# Altium schematic symbol library jlcpcb_2025_04_capacitors_extended_0402.schlib: 3594 symbols (part 17 of 20)
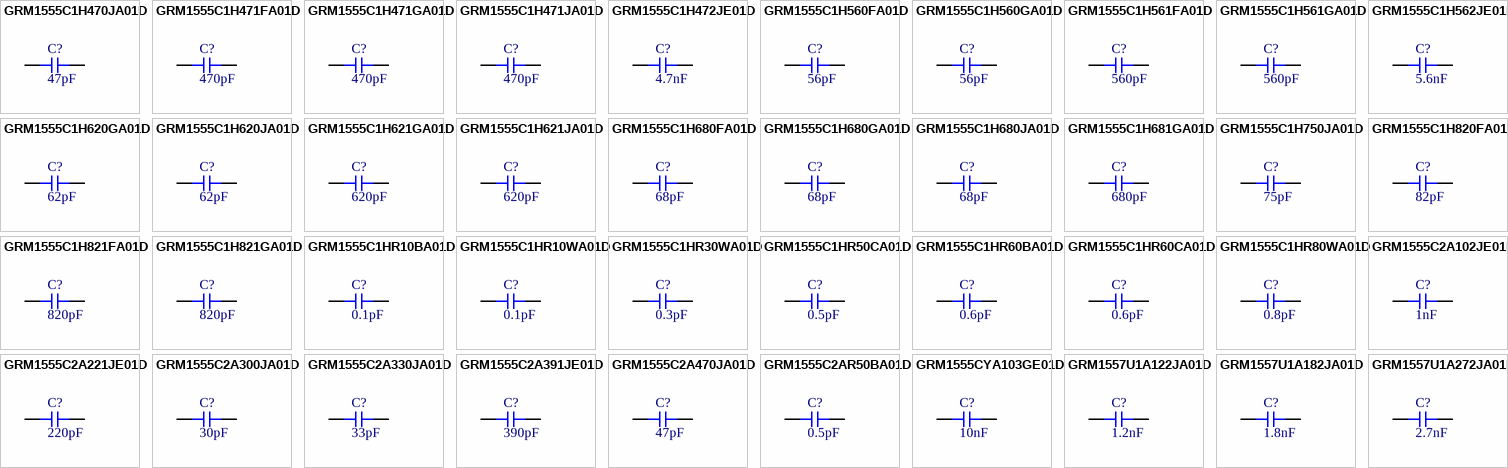
[diagram p105: symbols GRM1555C1H470JA01D to GRM1557U1A272JA01D]

## GRM1555C1H471FA01D
designator C?  Capacitance: 470pF  (hidden comment: *)
Capacitor, Ceramic (MLCC), 470pF, ±1%, 50V, C0G, ±1%, SMD 0402; Manufacturer: Murata Electronics; Manufacturer Part Number: GRM1555C1H471FA01D; Package Size: 0402; JLCPCB Basic Part: No; JLCPCB Part Number: C117605; Supplier 1: LCSC; Category: Capacitors - MLCC; Supplier Part Number 1: C117605; Tolerance: ±1%; Voltage Rating: 50V; Temperature Coefficient: C0G; RoHS: Yes; ComponentLink1Description: Datasheet; ComponentLink1URL: https://wmsc.lcsc.com/wmsc/upload/file/pdf/v2/lcsc/1811081510_Murata-Electronics-GRM1555C1H471FA01D_C117605.pdf; ComponentLink2Description: JLCPCB Part URL; ComponentLink2URL: https://jlcpcb.com/partdetail/C117605; ComponentLink3Description: LCSC Part URL; ComponentLink3URL: https://lcsc.com/product-detail/Multilayer-Ceramic-Capacitors-MLCC---SMD-SMT_Murata-Electronics-Murata-Electronics-GRM1555C1H471FA01D_C117605.html
footprint CAP-0402 (0402 (1005M) Capacitor)
pins: 1, 2

## GRM1555C1H471GA01D
designator C?  Capacitance: 470pF  (hidden comment: *)
Capacitor, Ceramic (MLCC), 470pF, ±2%, null, null, ±2%, SMD 0402; Manufacturer: Murata Electronics; Manufacturer Part Number: GRM1555C1H471GA01D; Package Size: 0402; JLCPCB Basic Part: No; JLCPCB Part Number: C701296; Supplier 1: LCSC; Category: Capacitors - MLCC; Supplier Part Number 1: C701296; Tolerance: ±2%; Voltage Rating: null; Temperature Coefficient: null; RoHS: Yes; ComponentLink1Description: Datasheet; ComponentLink1URL: https://wmsc.lcsc.com/wmsc/upload/file/pdf/v2/lcsc/2304140030_Murata-Electronics-GRM1555C1H471GA01D_C701296.pdf; ComponentLink2Description: JLCPCB Part URL; ComponentLink2URL: https://jlcpcb.com/partdetail/C701296; ComponentLink3Description: LCSC Part URL; ComponentLink3URL: https://lcsc.com/product-detail/Multilayer-Ceramic-Capacitors-MLCC---SMD-SMT_Murata-Electronics-Murata-Electronics-GRM1555C1H471GA01D_C701296.html
footprint CAP-0402 (0402 (1005M) Capacitor)
pins: 1, 2

## GRM1555C1H471JA01D
designator C?  Capacitance: 470pF  (hidden comment: *)
Capacitor, Ceramic (MLCC), 470pF, ±5%, 50V, C0G, ±5%, SMD 0402; Manufacturer: Murata Electronics; Manufacturer Part Number: GRM1555C1H471JA01D; Package Size: 0402; JLCPCB Basic Part: No; JLCPCB Part Number: C76971; Supplier 1: LCSC; Category: Capacitors - MLCC; Supplier Part Number 1: C76971; Tolerance: ±5%; Voltage Rating: 50V; Temperature Coefficient: C0G; RoHS: Yes; ComponentLink1Description: Datasheet; ComponentLink1URL: https://wmsc.lcsc.com/wmsc/upload/file/pdf/v2/lcsc/1811081616_Murata-Electronics-GRM1555C1H471JA01D_C76971.pdf; ComponentLink2Description: JLCPCB Part URL; ComponentLink2URL: https://jlcpcb.com/partdetail/C76971; ComponentLink3Description: LCSC Part URL; ComponentLink3URL: https://lcsc.com/product-detail/Multilayer-Ceramic-Capacitors-MLCC---SMD-SMT_Murata-Electronics-Murata-Electronics-GRM1555C1H471JA01D_C76971.html
footprint CAP-0402 (0402 (1005M) Capacitor)
pins: 1, 2

## GRM1555C1H472JE01D
designator C?  Capacitance: 4.7nF  (hidden comment: *)
Capacitor, Ceramic (MLCC), 4.7nF, ±5%, 50V, C0G, ±5%, SMD 0402; Manufacturer: Murata Electronics; Manufacturer Part Number: GRM1555C1H472JE01D; Package Size: 0402; JLCPCB Basic Part: No; JLCPCB Part Number: C1518204; Supplier 1: LCSC; Category: Capacitors - MLCC; Supplier Part Number 1: C1518204; Tolerance: ±5%; Voltage Rating: 50V; Temperature Coefficient: C0G; RoHS: Yes; ComponentLink1Description: Datasheet; ComponentLink1URL: https://wmsc.lcsc.com/wmsc/upload/file/pdf/v2/lcsc/2111031730_Murata-Electronics-GRM1555C1H472JE01D_C1518204.pdf; ComponentLink2Description: JLCPCB Part URL; ComponentLink2URL: https://jlcpcb.com/partdetail/C1518204; ComponentLink3Description: LCSC Part URL; ComponentLink3URL: https://lcsc.com/product-detail/Multilayer-Ceramic-Capacitors-MLCC---SMD-SMT_Murata-Electronics-Murata-Electronics-GRM1555C1H472JE01D_C1518204.html
footprint CAP-0402 (0402 (1005M) Capacitor)
pins: 1, 2

## GRM1555C1H560FA01D
designator C?  Capacitance: 56pF  (hidden comment: *)
Capacitor, Ceramic (MLCC), 56pF, ±1%, 50V, null, ±1%, SMD 0402; Manufacturer: Murata Electronics; Manufacturer Part Number: GRM1555C1H560FA01D; Package Size: 0402; JLCPCB Basic Part: No; JLCPCB Part Number: C162113; Supplier 1: LCSC; Category: Capacitors - MLCC; Supplier Part Number 1: C162113; Tolerance: ±1%; Voltage Rating: 50V; Temperature Coefficient: null; RoHS: Yes; ComponentLink1Description: Datasheet; ComponentLink1URL: https://wmsc.lcsc.com/wmsc/upload/file/pdf/v2/lcsc/2011191404_Murata-Electronics-GRM1555C1H560FA01D_C162113.pdf; ComponentLink2Description: JLCPCB Part URL; ComponentLink2URL: https://jlcpcb.com/partdetail/C162113; ComponentLink3Description: LCSC Part URL; ComponentLink3URL: https://lcsc.com/product-detail/Multilayer-Ceramic-Capacitors-MLCC---SMD-SMT_Murata-Electronics-Murata-Electronics-GRM1555C1H560FA01D_C162113.html
footprint CAP-0402 (0402 (1005M) Capacitor)
pins: 1, 2

## GRM1555C1H560GA01D
designator C?  Capacitance: 56pF  (hidden comment: *)
Capacitor, Ceramic (MLCC), 56pF, ±2%, 50V, null, ±2%, SMD 0402; Manufacturer: Murata Electronics; Manufacturer Part Number: GRM1555C1H560GA01D; Package Size: 0402; JLCPCB Basic Part: No; JLCPCB Part Number: C162114; Supplier 1: LCSC; Category: Capacitors - MLCC; Supplier Part Number 1: C162114; Tolerance: ±2%; Voltage Rating: 50V; Temperature Coefficient: null; RoHS: Yes; ComponentLink1Description: Datasheet; ComponentLink1URL: https://wmsc.lcsc.com/wmsc/upload/file/pdf/v2/lcsc/2105241135_Murata-Electronics-GRM1555C1H560GA01D_C162114.pdf; ComponentLink2Description: JLCPCB Part URL; ComponentLink2URL: https://jlcpcb.com/partdetail/C162114; ComponentLink3Description: LCSC Part URL; ComponentLink3URL: https://lcsc.com/product-detail/Multilayer-Ceramic-Capacitors-MLCC---SMD-SMT_Murata-Electronics-Murata-Electronics-GRM1555C1H560GA01D_C162114.html
footprint CAP-0402 (0402 (1005M) Capacitor)
pins: 1, 2

## GRM1555C1H561FA01D
designator C?  Capacitance: 560pF  (hidden comment: *)
Capacitor, Ceramic (MLCC), 560pF, ±1%, null, null, ±1%, SMD 0402; Manufacturer: Murata Electronics; Manufacturer Part Number: GRM1555C1H561FA01D; Package Size: 0402; JLCPCB Basic Part: No; JLCPCB Part Number: C907748; Supplier 1: LCSC; Category: Capacitors - MLCC; Supplier Part Number 1: C907748; Tolerance: ±1%; Voltage Rating: null; Temperature Coefficient: null; RoHS: Yes; ComponentLink1Description: Datasheet; ComponentLink1URL: https://wmsc.lcsc.com/wmsc/upload/file/pdf/v2/lcsc/2201242100_Murata-Electronics-GRM1555C1H561FA01D_C907748.pdf; ComponentLink2Description: JLCPCB Part URL; ComponentLink2URL: https://jlcpcb.com/partdetail/C907748; ComponentLink3Description: LCSC Part URL; ComponentLink3URL: https://lcsc.com/product-detail/Multilayer-Ceramic-Capacitors-MLCC---SMD-SMT_Murata-Electronics-Murata-Electronics-GRM1555C1H561FA01D_C907748.html
footprint CAP-0402 (0402 (1005M) Capacitor)
pins: 1, 2

## GRM1555C1H561GA01D
designator C?  Capacitance: 560pF  (hidden comment: *)
Capacitor, Ceramic (MLCC), 560pF, ±2%, 50V, C0G, ±2%, SMD 0402; Manufacturer: Murata Electronics; Manufacturer Part Number: GRM1555C1H561GA01D; Package Size: 0402; JLCPCB Basic Part: No; JLCPCB Part Number: C440169; Supplier 1: LCSC; Category: Capacitors - MLCC; Supplier Part Number 1: C440169; Tolerance: ±2%; Voltage Rating: 50V; Temperature Coefficient: C0G; RoHS: Yes; ComponentLink1Description: Datasheet; ComponentLink1URL: https://wmsc.lcsc.com/wmsc/upload/file/pdf/v2/lcsc/2304140030_Murata-Electronics-GRM1555C1H561GA01D_C440169.pdf; ComponentLink2Description: JLCPCB Part URL; ComponentLink2URL: https://jlcpcb.com/partdetail/C440169; ComponentLink3Description: LCSC Part URL; ComponentLink3URL: https://lcsc.com/product-detail/Multilayer-Ceramic-Capacitors-MLCC---SMD-SMT_Murata-Electronics-Murata-Electronics-GRM1555C1H561GA01D_C440169.html
footprint CAP-0402 (0402 (1005M) Capacitor)
pins: 1, 2

## GRM1555C1H562JE01D
designator C?  Capacitance: 5.6nF  (hidden comment: *)
Capacitor, Ceramic (MLCC), 5.6nF, ±5%, 50V, C0G, ±5%, SMD 0402; Manufacturer: Murata Electronics; Manufacturer Part Number: GRM1555C1H562JE01D; Package Size: 0402; JLCPCB Basic Part: No; JLCPCB Part Number: C2976066; Supplier 1: LCSC; Category: Capacitors - MLCC; Supplier Part Number 1: C2976066; Tolerance: ±5%; Voltage Rating: 50V; Temperature Coefficient: C0G; RoHS: Yes; ComponentLink1Description: Datasheet; ComponentLink1URL: https://wmsc.lcsc.com/wmsc/upload/file/pdf/v2/lcsc/2202221130_Murata-Electronics-GRM1555C1H562JE01D_C2976066.pdf; ComponentLink2Description: JLCPCB Part URL; ComponentLink2URL: https://jlcpcb.com/partdetail/C2976066; ComponentLink3Description: LCSC Part URL; ComponentLink3URL: https://lcsc.com/product-detail/Multilayer-Ceramic-Capacitors-MLCC---SMD-SMT_Murata-Electronics-Murata-Electronics-GRM1555C1H562JE01D_C2976066.html
footprint CAP-0402 (0402 (1005M) Capacitor)
pins: 1, 2

## GRM1555C1H620GA01D
designator C?  Capacitance: 62pF  (hidden comment: *)
Capacitor, Ceramic (MLCC), 62pF, ±2%, 50V, C0G, ±2%, SMD 0402; Manufacturer: Murata Electronics; Manufacturer Part Number: GRM1555C1H620GA01D; Package Size: 0402; JLCPCB Basic Part: No; JLCPCB Part Number: C464416; Supplier 1: LCSC; Category: Capacitors - MLCC; Supplier Part Number 1: C464416; Tolerance: ±2%; Voltage Rating: 50V; Temperature Coefficient: C0G; RoHS: Yes; ComponentLink1Description: Datasheet; ComponentLink1URL: https://wmsc.lcsc.com/wmsc/upload/file/pdf/v2/lcsc/2304140030_Murata-Electronics-GRM1555C1H620GA01D_C464416.pdf; ComponentLink2Description: JLCPCB Part URL; ComponentLink2URL: https://jlcpcb.com/partdetail/C464416; ComponentLink3Description: LCSC Part URL; ComponentLink3URL: https://lcsc.com/product-detail/Multilayer-Ceramic-Capacitors-MLCC---SMD-SMT_Murata-Electronics-Murata-Electronics-GRM1555C1H620GA01D_C464416.html
footprint CAP-0402 (0402 (1005M) Capacitor)
pins: 1, 2

## GRM1555C1H620JA01D
designator C?  Capacitance: 62pF  (hidden comment: *)
Capacitor, Ceramic (MLCC), 62pF, ±5%, 50V, null, ±5%, SMD 0402; Manufacturer: Murata Electronics; Manufacturer Part Number: GRM1555C1H620JA01D; Package Size: 0402; JLCPCB Basic Part: No; JLCPCB Part Number: C162115; Supplier 1: LCSC; Category: Capacitors - MLCC; Supplier Part Number 1: C162115; Tolerance: ±5%; Voltage Rating: 50V; Temperature Coefficient: null; RoHS: Yes; ComponentLink1Description: Datasheet; ComponentLink1URL: https://wmsc.lcsc.com/wmsc/upload/file/pdf/v2/lcsc/2105241135_Murata-Electronics-GRM1555C1H620JA01D_C162115.pdf; ComponentLink2Description: JLCPCB Part URL; ComponentLink2URL: https://jlcpcb.com/partdetail/C162115; ComponentLink3Description: LCSC Part URL; ComponentLink3URL: https://lcsc.com/product-detail/Multilayer-Ceramic-Capacitors-MLCC---SMD-SMT_Murata-Electronics-Murata-Electronics-GRM1555C1H620JA01D_C162115.html
footprint CAP-0402 (0402 (1005M) Capacitor)
pins: 1, 2

## GRM1555C1H621GA01D
designator C?  Capacitance: 620pF  (hidden comment: *)
Capacitor, Ceramic (MLCC), 620pF, ±2%, 50V, C0G, ±2%, SMD 0402; Manufacturer: Murata Electronics; Manufacturer Part Number: GRM1555C1H621GA01D; Package Size: 0402; JLCPCB Basic Part: No; JLCPCB Part Number: C415543; Supplier 1: LCSC; Category: Capacitors - MLCC; Supplier Part Number 1: C415543; Tolerance: ±2%; Voltage Rating: 50V; Temperature Coefficient: C0G; RoHS: Yes; ComponentLink1Description: Datasheet; ComponentLink1URL: https://wmsc.lcsc.com/wmsc/upload/file/pdf/v2/lcsc/2304140030_Murata-Electronics-GRM1555C1H621GA01D_C415543.pdf; ComponentLink2Description: JLCPCB Part URL; ComponentLink2URL: https://jlcpcb.com/partdetail/C415543; ComponentLink3Description: LCSC Part URL; ComponentLink3URL: https://lcsc.com/product-detail/Multilayer-Ceramic-Capacitors-MLCC---SMD-SMT_Murata-Electronics-Murata-Electronics-GRM1555C1H621GA01D_C415543.html
footprint CAP-0402 (0402 (1005M) Capacitor)
pins: 1, 2

## GRM1555C1H621JA01D
designator C?  Capacitance: 620pF  (hidden comment: *)
Capacitor, Ceramic (MLCC), 620pF, ±5%, 50V, C0G, ±5%, SMD 0402; Manufacturer: Murata Electronics; Manufacturer Part Number: GRM1555C1H621JA01D; Package Size: 0402; JLCPCB Basic Part: No; JLCPCB Part Number: C162116; Supplier 1: LCSC; Category: Capacitors - MLCC; Supplier Part Number 1: C162116; Tolerance: ±5%; Voltage Rating: 50V; Temperature Coefficient: C0G; RoHS: Yes; ComponentLink1Description: Datasheet; ComponentLink1URL: https://wmsc.lcsc.com/wmsc/upload/file/pdf/v2/lcsc/2205061616_Murata-Electronics-GRM1555C1H621JA01D_C162116.pdf; ComponentLink2Description: JLCPCB Part URL; ComponentLink2URL: https://jlcpcb.com/partdetail/C162116; ComponentLink3Description: LCSC Part URL; ComponentLink3URL: https://lcsc.com/product-detail/Multilayer-Ceramic-Capacitors-MLCC---SMD-SMT_Murata-Electronics-Murata-Electronics-GRM1555C1H621JA01D_C162116.html
footprint CAP-0402 (0402 (1005M) Capacitor)
pins: 1, 2

## GRM1555C1H680FA01D
designator C?  Capacitance: 68pF  (hidden comment: *)
Capacitor, Ceramic (MLCC), 68pF, ±1%, 50V, C0G, ±1%, SMD 0402; Manufacturer: Murata Electronics; Manufacturer Part Number: GRM1555C1H680FA01D; Package Size: 0402; JLCPCB Basic Part: No; JLCPCB Part Number: C162117; Supplier 1: LCSC; Category: Capacitors - MLCC; Supplier Part Number 1: C162117; Tolerance: ±1%; Voltage Rating: 50V; Temperature Coefficient: C0G; RoHS: Yes; ComponentLink1Description: Datasheet; ComponentLink1URL: https://wmsc.lcsc.com/wmsc/upload/file/pdf/v2/lcsc/1912111437_Murata-Electronics-GRM1555C1H680FA01D_C162117.pdf; ComponentLink2Description: JLCPCB Part URL; ComponentLink2URL: https://jlcpcb.com/partdetail/C162117; ComponentLink3Description: LCSC Part URL; ComponentLink3URL: https://lcsc.com/product-detail/Multilayer-Ceramic-Capacitors-MLCC---SMD-SMT_Murata-Electronics-Murata-Electronics-GRM1555C1H680FA01D_C162117.html
footprint CAP-0402 (0402 (1005M) Capacitor)
pins: 1, 2

## GRM1555C1H680GA01D
designator C?  Capacitance: 68pF  (hidden comment: *)
Capacitor, Ceramic (MLCC), 68pF, ±2%, null, null, ±2%, SMD 0402; Manufacturer: Murata Electronics; Manufacturer Part Number: GRM1555C1H680GA01D; Package Size: 0402; JLCPCB Basic Part: No; JLCPCB Part Number: C237510; Supplier 1: LCSC; Category: Capacitors - MLCC; Supplier Part Number 1: C237510; Tolerance: ±2%; Voltage Rating: null; Temperature Coefficient: null; RoHS: Yes; ComponentLink1Description: Datasheet; ComponentLink1URL: https://wmsc.lcsc.com/wmsc/upload/file/pdf/v2/lcsc/2010101433_Murata-Electronics-GRM1555C1H680GA01D_C237510.pdf; ComponentLink2Description: JLCPCB Part URL; ComponentLink2URL: https://jlcpcb.com/partdetail/C237510; ComponentLink3Description: LCSC Part URL; ComponentLink3URL: https://lcsc.com/product-detail/Multilayer-Ceramic-Capacitors-MLCC---SMD-SMT_Murata-Electronics-Murata-Electronics-GRM1555C1H680GA01D_C237510.html
footprint CAP-0402 (0402 (1005M) Capacitor)
pins: 1, 2

## GRM1555C1H680JA01D
designator C?  Capacitance: 68pF  (hidden comment: *)
Capacitor, Ceramic (MLCC), 68pF, ±5%, 50V, C0G, ±5%, SMD 0402; Manufacturer: Murata Electronics; Manufacturer Part Number: GRM1555C1H680JA01D; Package Size: 0402; JLCPCB Basic Part: No; JLCPCB Part Number: C76977; Supplier 1: LCSC; Category: Capacitors - MLCC; Supplier Part Number 1: C76977; Tolerance: ±5%; Voltage Rating: 50V; Temperature Coefficient: C0G; RoHS: Yes; ComponentLink1Description: Datasheet; ComponentLink1URL: https://wmsc.lcsc.com/wmsc/upload/file/pdf/v2/lcsc/1811081616_Murata-Electronics-GRM1555C1H680JA01D_C76977.pdf; ComponentLink2Description: JLCPCB Part URL; ComponentLink2URL: https://jlcpcb.com/partdetail/C76977; ComponentLink3Description: LCSC Part URL; ComponentLink3URL: https://lcsc.com/product-detail/Multilayer-Ceramic-Capacitors-MLCC---SMD-SMT_Murata-Electronics-Murata-Electronics-GRM1555C1H680JA01D_C76977.html
footprint CAP-0402 (0402 (1005M) Capacitor)
pins: 1, 2

## GRM1555C1H681GA01D
designator C?  Capacitance: 680pF  (hidden comment: *)
Capacitor, Ceramic (MLCC), 680pF, ±2%, 50V, C0G, ±2%, SMD 0402; Manufacturer: Murata Electronics; Manufacturer Part Number: GRM1555C1H681GA01D; Package Size: 0402; JLCPCB Basic Part: No; JLCPCB Part Number: C710849; Supplier 1: LCSC; Category: Capacitors - MLCC; Supplier Part Number 1: C710849; Tolerance: ±2%; Voltage Rating: 50V; Temperature Coefficient: C0G; RoHS: Yes; ComponentLink1Description: Datasheet; ComponentLink1URL: https://wmsc.lcsc.com/wmsc/upload/file/pdf/v2/lcsc/2308111504_Murata-Electronics-GRM1555C1H681GA01D_C710849.pdf; ComponentLink2Description: JLCPCB Part URL; ComponentLink2URL: https://jlcpcb.com/partdetail/C710849; ComponentLink3Description: LCSC Part URL; ComponentLink3URL: https://lcsc.com/product-detail/Multilayer-Ceramic-Capacitors-MLCC---SMD-SMT_Murata-Electronics-Murata-Electronics-GRM1555C1H681GA01D_C710849.html
footprint CAP-0402 (0402 (1005M) Capacitor)
pins: 1, 2

## GRM1555C1H750JA01D
designator C?  Capacitance: 75pF  (hidden comment: *)
Capacitor, Ceramic (MLCC), 75pF, ±5%, 50V, C0G, ±5%, SMD 0402; Manufacturer: Murata Electronics; Manufacturer Part Number: GRM1555C1H750JA01D; Package Size: 0402; JLCPCB Basic Part: No; JLCPCB Part Number: C162121; Supplier 1: LCSC; Category: Capacitors - MLCC; Supplier Part Number 1: C162121; Tolerance: ±5%; Voltage Rating: 50V; Temperature Coefficient: C0G; RoHS: Yes; ComponentLink1Description: Datasheet; ComponentLink1URL: https://wmsc.lcsc.com/wmsc/upload/file/pdf/v2/lcsc/2304140030_Murata-Electronics-GRM1555C1H750JA01D_C162121.pdf; ComponentLink2Description: JLCPCB Part URL; ComponentLink2URL: https://jlcpcb.com/partdetail/C162121; ComponentLink3Description: LCSC Part URL; ComponentLink3URL: https://lcsc.com/product-detail/Multilayer-Ceramic-Capacitors-MLCC---SMD-SMT_Murata-Electronics-Murata-Electronics-GRM1555C1H750JA01D_C162121.html
footprint CAP-0402 (0402 (1005M) Capacitor)
pins: 1, 2

## GRM1555C1H820FA01D
designator C?  Capacitance: 82pF  (hidden comment: *)
Capacitor, Ceramic (MLCC), 82pF, ±1%, 50V, C0G, ±1%, SMD 0402; Manufacturer: Murata Electronics; Manufacturer Part Number: GRM1555C1H820FA01D; Package Size: 0402; JLCPCB Basic Part: No; JLCPCB Part Number: C162123; Supplier 1: LCSC; Category: Capacitors - MLCC; Supplier Part Number 1: C162123; Tolerance: ±1%; Voltage Rating: 50V; Temperature Coefficient: C0G; RoHS: Yes; ComponentLink1Description: Datasheet; ComponentLink1URL: https://wmsc.lcsc.com/wmsc/upload/file/pdf/v2/lcsc/2304140030_Murata-Electronics-GRM1555C1H820FA01D_C162123.pdf; ComponentLink2Description: JLCPCB Part URL; ComponentLink2URL: https://jlcpcb.com/partdetail/C162123; ComponentLink3Description: LCSC Part URL; ComponentLink3URL: https://lcsc.com/product-detail/Multilayer-Ceramic-Capacitors-MLCC---SMD-SMT_Murata-Electronics-Murata-Electronics-GRM1555C1H820FA01D_C162123.html
footprint CAP-0402 (0402 (1005M) Capacitor)
pins: 1, 2

## GRM1555C1H821FA01D
designator C?  Capacitance: 820pF  (hidden comment: *)
Capacitor, Ceramic (MLCC), 820pF, ±1%, null, null, ±1%, SMD 0402; Manufacturer: Murata Electronics; Manufacturer Part Number: GRM1555C1H821FA01D; Package Size: 0402; JLCPCB Basic Part: No; JLCPCB Part Number: C913510; Supplier 1: LCSC; Category: Capacitors - MLCC; Supplier Part Number 1: C913510; Tolerance: ±1%; Voltage Rating: null; Temperature Coefficient: null; RoHS: Yes; ComponentLink1Description: Datasheet; ComponentLink1URL: https://wmsc.lcsc.com/wmsc/upload/file/pdf/v2/lcsc/2201131300_Murata-Electronics-GRM1555C1H821FA01D_C913510.pdf; ComponentLink2Description: JLCPCB Part URL; ComponentLink2URL: https://jlcpcb.com/partdetail/C913510; ComponentLink3Description: LCSC Part URL; ComponentLink3URL: https://lcsc.com/product-detail/Multilayer-Ceramic-Capacitors-MLCC---SMD-SMT_Murata-Electronics-Murata-Electronics-GRM1555C1H821FA01D_C913510.html
footprint CAP-0402 (0402 (1005M) Capacitor)
pins: 1, 2

## GRM1555C1H821GA01D
designator C?  Capacitance: 820pF  (hidden comment: *)
Capacitor, Ceramic (MLCC), 820pF, ±2%, null, null, ±2%, SMD 0402; Manufacturer: Murata Electronics; Manufacturer Part Number: GRM1555C1H821GA01D; Package Size: 0402; JLCPCB Basic Part: No; JLCPCB Part Number: C237511; Supplier 1: LCSC; Category: Capacitors - MLCC; Supplier Part Number 1: C237511; Tolerance: ±2%; Voltage Rating: null; Temperature Coefficient: null; RoHS: Yes; ComponentLink1Description: Datasheet; ComponentLink1URL: https://wmsc.lcsc.com/wmsc/upload/file/pdf/v2/lcsc/2101081032_Murata-Electronics-GRM1555C1H821GA01D_C237511.pdf; ComponentLink2Description: JLCPCB Part URL; ComponentLink2URL: https://jlcpcb.com/partdetail/C237511; ComponentLink3Description: LCSC Part URL; ComponentLink3URL: https://lcsc.com/product-detail/Multilayer-Ceramic-Capacitors-MLCC---SMD-SMT_Murata-Electronics-Murata-Electronics-GRM1555C1H821GA01D_C237511.html
footprint CAP-0402 (0402 (1005M) Capacitor)
pins: 1, 2

## GRM1555C1HR10BA01D
designator C?  Capacitance: 0.1pF  (hidden comment: *)
Capacitor, Ceramic (MLCC), 0.1pF, SMD 0402; Manufacturer: Murata Electronics; Manufacturer Part Number: GRM1555C1HR10BA01D; Package Size: 0402; JLCPCB Basic Part: No; JLCPCB Part Number: C913704; Supplier 1: LCSC; Category: Capacitors - MLCC; Supplier Part Number 1: C913704; RoHS: Yes; ComponentLink1Description: Datasheet; ComponentLink2Description: JLCPCB Part URL; ComponentLink2URL: https://jlcpcb.com/partdetail/C913704; ComponentLink3Description: LCSC Part URL; ComponentLink3URL: https://lcsc.com/product-detail/Multilayer-Ceramic-Capacitors-MLCC---SMD-SMT_Murata-Electronics-Murata-Electronics-GRM1555C1HR10BA01D_C913704.html
footprint CAP-0402 (0402 (1005M) Capacitor)
pins: 1, 2

## GRM1555C1HR10WA01D
designator C?  Capacitance: 0.1pF  (hidden comment: *)
Capacitor, Ceramic (MLCC), 0.1pF, 50V, C0G, SMD 0402; Manufacturer: Murata Electronics; Manufacturer Part Number: GRM1555C1HR10WA01D; Package Size: 0402; JLCPCB Basic Part: No; JLCPCB Part Number: C441757; Supplier 1: LCSC; Category: Capacitors - MLCC; Supplier Part Number 1: C441757; Voltage Rating: 50V; Temperature Coefficient: C0G; RoHS: Yes; ComponentLink1Description: Datasheet; ComponentLink1URL: https://wmsc.lcsc.com/wmsc/upload/file/pdf/v2/lcsc/2304140030_Murata-Electronics-GRM1555C1HR10WA01D_C441757.pdf; ComponentLink2Description: JLCPCB Part URL; ComponentLink2URL: https://jlcpcb.com/partdetail/C441757; ComponentLink3Description: LCSC Part URL; ComponentLink3URL: https://lcsc.com/product-detail/Multilayer-Ceramic-Capacitors-MLCC---SMD-SMT_Murata-Electronics-Murata-Electronics-GRM1555C1HR10WA01D_C441757.html
footprint CAP-0402 (0402 (1005M) Capacitor)
pins: 1, 2

## GRM1555C1HR30WA01D
designator C?  Capacitance: 0.3pF  (hidden comment: *)
Capacitor, Ceramic (MLCC), 0.3pF, 50V, C0G, SMD 0402; Manufacturer: Murata Electronics; Manufacturer Part Number: GRM1555C1HR30WA01D; Package Size: 0402; JLCPCB Basic Part: No; JLCPCB Part Number: C92338; Supplier 1: LCSC; Category: Capacitors - MLCC; Supplier Part Number 1: C92338; Voltage Rating: 50V; Temperature Coefficient: C0G; RoHS: Yes; ComponentLink1Description: Datasheet; ComponentLink1URL: https://wmsc.lcsc.com/wmsc/upload/file/pdf/v2/lcsc/2001171841_Murata-Electronics-GRM1555C1HR30WA01D_C92338.pdf; ComponentLink2Description: JLCPCB Part URL; ComponentLink2URL: https://jlcpcb.com/partdetail/C92338; ComponentLink3Description: LCSC Part URL; ComponentLink3URL: https://lcsc.com/product-detail/Multilayer-Ceramic-Capacitors-MLCC---SMD-SMT_Murata-Electronics-Murata-Electronics-GRM1555C1HR30WA01D_C92338.html
footprint CAP-0402 (0402 (1005M) Capacitor)
pins: 1, 2

## GRM1555C1HR50CA01D
designator C?  Capacitance: 0.5pF  (hidden comment: *)
Capacitor, Ceramic (MLCC), 0.5pF, 50V, C0G, SMD 0402; Manufacturer: Murata Electronics; Manufacturer Part Number: GRM1555C1HR50CA01D; Package Size: 0402; JLCPCB Basic Part: No; JLCPCB Part Number: C76987; Supplier 1: LCSC; Category: Capacitors - MLCC; Supplier Part Number 1: C76987; Voltage Rating: 50V; Temperature Coefficient: C0G; RoHS: Yes; ComponentLink1Description: Datasheet; ComponentLink1URL: https://wmsc.lcsc.com/wmsc/upload/file/pdf/v2/lcsc/2304140030_Murata-Electronics-GRM1555C1HR50CA01D_C76987.pdf; ComponentLink2Description: JLCPCB Part URL; ComponentLink2URL: https://jlcpcb.com/partdetail/C76987; ComponentLink3Description: LCSC Part URL; ComponentLink3URL: https://lcsc.com/product-detail/Multilayer-Ceramic-Capacitors-MLCC---SMD-SMT_Murata-Electronics-Murata-Electronics-GRM1555C1HR50CA01D_C76987.html
footprint CAP-0402 (0402 (1005M) Capacitor)
pins: 1, 2

## GRM1555C1HR60BA01D
designator C?  Capacitance: 0.6pF  (hidden comment: *)
Capacitor, Ceramic (MLCC), 0.6pF, 50V, C0G, SMD 0402; Manufacturer: Murata Electronics; Manufacturer Part Number: GRM1555C1HR60BA01D; Package Size: 0402; JLCPCB Basic Part: No; JLCPCB Part Number: C162133; Supplier 1: LCSC; Category: Capacitors - MLCC; Supplier Part Number 1: C162133; Voltage Rating: 50V; Temperature Coefficient: C0G; RoHS: Yes; ComponentLink1Description: Datasheet; ComponentLink1URL: https://wmsc.lcsc.com/wmsc/upload/file/pdf/v2/lcsc/2304140030_Murata-Electronics-GRM1555C1HR60BA01D_C162133.pdf; ComponentLink2Description: JLCPCB Part URL; ComponentLink2URL: https://jlcpcb.com/partdetail/C162133; ComponentLink3Description: LCSC Part URL; ComponentLink3URL: https://lcsc.com/product-detail/Multilayer-Ceramic-Capacitors-MLCC---SMD-SMT_Murata-Electronics-Murata-Electronics-GRM1555C1HR60BA01D_C162133.html
footprint CAP-0402 (0402 (1005M) Capacitor)
pins: 1, 2

## GRM1555C1HR60CA01D
designator C?  Capacitance: 0.6pF  (hidden comment: *)
Capacitor, Ceramic (MLCC), 0.6pF, 50V, C0G, SMD 0402; Manufacturer: Murata Electronics; Manufacturer Part Number: GRM1555C1HR60CA01D; Package Size: 0402; JLCPCB Basic Part: No; JLCPCB Part Number: C426333; Supplier 1: LCSC; Category: Capacitors - MLCC; Supplier Part Number 1: C426333; Voltage Rating: 50V; Temperature Coefficient: C0G; RoHS: Yes; ComponentLink1Description: Datasheet; ComponentLink1URL: https://wmsc.lcsc.com/wmsc/upload/file/pdf/v2/lcsc/2304140030_Murata-Electronics-GRM1555C1HR60CA01D_C426333.pdf; ComponentLink2Description: JLCPCB Part URL; ComponentLink2URL: https://jlcpcb.com/partdetail/C426333; ComponentLink3Description: LCSC Part URL; ComponentLink3URL: https://lcsc.com/product-detail/Multilayer-Ceramic-Capacitors-MLCC---SMD-SMT_Murata-Electronics-Murata-Electronics-GRM1555C1HR60CA01D_C426333.html
footprint CAP-0402 (0402 (1005M) Capacitor)
pins: 1, 2

## GRM1555C1HR80WA01D
designator C?  Capacitance: 0.8pF  (hidden comment: *)
Capacitor, Ceramic (MLCC), 0.8pF, 50V, C0G, SMD 0402; Manufacturer: Murata Electronics; Manufacturer Part Number: GRM1555C1HR80WA01D; Package Size: 0402; JLCPCB Basic Part: No; JLCPCB Part Number: C162138; Supplier 1: LCSC; Category: Capacitors - MLCC; Supplier Part Number 1: C162138; Voltage Rating: 50V; Temperature Coefficient: C0G; RoHS: Yes; ComponentLink1Description: Datasheet; ComponentLink1URL: https://wmsc.lcsc.com/wmsc/upload/file/pdf/v2/lcsc/2304140030_Murata-Electronics-GRM1555C1HR80WA01D_C162138.pdf; ComponentLink2Description: JLCPCB Part URL; ComponentLink2URL: https://jlcpcb.com/partdetail/C162138; ComponentLink3Description: LCSC Part URL; ComponentLink3URL: https://lcsc.com/product-detail/Multilayer-Ceramic-Capacitors-MLCC---SMD-SMT_Murata-Electronics-Murata-Electronics-GRM1555C1HR80WA01D_C162138.html
footprint CAP-0402 (0402 (1005M) Capacitor)
pins: 1, 2

## GRM1555C2A102JE01D
designator C?  Capacitance: 1nF  (hidden comment: *)
Capacitor, Ceramic (MLCC), 1nF, ±5%, 100V, null, ±5%, SMD 0402; Manufacturer: Murata Electronics; Manufacturer Part Number: GRM1555C2A102JE01D; Package Size: 0402; JLCPCB Basic Part: No; JLCPCB Part Number: C883557; Supplier 1: LCSC; Category: Capacitors - MLCC; Supplier Part Number 1: C883557; Tolerance: ±5%; Voltage Rating: 100V; Temperature Coefficient: null; RoHS: Yes; ComponentLink1Description: Datasheet; ComponentLink1URL: https://wmsc.lcsc.com/wmsc/upload/file/pdf/v2/lcsc/2304140030_Murata-Electronics-GRM1555C2A102JE01D_C883557.pdf; ComponentLink2Description: JLCPCB Part URL; ComponentLink2URL: https://jlcpcb.com/partdetail/C883557; ComponentLink3Description: LCSC Part URL; ComponentLink3URL: https://lcsc.com/product-detail/Multilayer-Ceramic-Capacitors-MLCC---SMD-SMT_Murata-Electronics-Murata-Electronics-GRM1555C2A102JE01D_C883557.html
footprint CAP-0402 (0402 (1005M) Capacitor)
pins: 1, 2

## GRM1555C2A221JE01D
designator C?  Capacitance: 220pF  (hidden comment: *)
Capacitor, Ceramic (MLCC), 220pF, ±5%, 100V, C0G, ±5%, SMD 0402; Manufacturer: Murata Electronics; Manufacturer Part Number: GRM1555C2A221JE01D; Package Size: 0402; JLCPCB Basic Part: No; JLCPCB Part Number: C1518203; Supplier 1: LCSC; Category: Capacitors - MLCC; Supplier Part Number 1: C1518203; Tolerance: ±5%; Voltage Rating: 100V; Temperature Coefficient: C0G; RoHS: Yes; ComponentLink1Description: Datasheet; ComponentLink1URL: https://wmsc.lcsc.com/wmsc/upload/file/pdf/v2/lcsc/2111031730_Murata-Electronics-GRM1555C2A221JE01D_C1518203.pdf; ComponentLink2Description: JLCPCB Part URL; ComponentLink2URL: https://jlcpcb.com/partdetail/C1518203; ComponentLink3Description: LCSC Part URL; ComponentLink3URL: https://lcsc.com/product-detail/Multilayer-Ceramic-Capacitors-MLCC---SMD-SMT_Murata-Electronics-Murata-Electronics-GRM1555C2A221JE01D_C1518203.html
footprint CAP-0402 (0402 (1005M) Capacitor)
pins: 1, 2

## GRM1555C2A300JA01D
designator C?  Capacitance: 30pF  (hidden comment: *)
Capacitor, Ceramic (MLCC), 30pF, ±5%, ±5%, SMD 0402; Manufacturer: Murata Electronics; Manufacturer Part Number: GRM1555C2A300JA01D; Package Size: 0402; JLCPCB Basic Part: No; JLCPCB Part Number: C883556; Supplier 1: LCSC; Category: Capacitors - MLCC; Supplier Part Number 1: C883556; Tolerance: ±5%; RoHS: Yes; ComponentLink1Description: Datasheet; ComponentLink1URL: https://wmsc.lcsc.com/wmsc/upload/file/pdf/v2/lcsc/2304140030_Murata-Electronics-GRM1555C2A300JA01D_C883556.pdf; ComponentLink2Description: JLCPCB Part URL; ComponentLink2URL: https://jlcpcb.com/partdetail/C883556; ComponentLink3Description: LCSC Part URL; ComponentLink3URL: https://lcsc.com/product-detail/Multilayer-Ceramic-Capacitors-MLCC---SMD-SMT_Murata-Electronics-Murata-Electronics-GRM1555C2A300JA01D_C883556.html
footprint CAP-0402 (0402 (1005M) Capacitor)
pins: 1, 2

## GRM1555C2A330JA01D
designator C?  Capacitance: 33pF  (hidden comment: *)
Capacitor, Ceramic (MLCC), 33pF, ±5%, 100V, null, ±5%, SMD 0402; Manufacturer: Murata Electronics; Manufacturer Part Number: GRM1555C2A330JA01D; Package Size: 0402; JLCPCB Basic Part: No; JLCPCB Part Number: C882539; Supplier 1: LCSC; Category: Capacitors - MLCC; Supplier Part Number 1: C882539; Tolerance: ±5%; Voltage Rating: 100V; Temperature Coefficient: null; RoHS: Yes; ComponentLink1Description: Datasheet; ComponentLink1URL: https://wmsc.lcsc.com/wmsc/upload/file/pdf/v2/lcsc/2201242130_Murata-Electronics-GRM1555C2A330JA01D_C882539.pdf; ComponentLink2Description: JLCPCB Part URL; ComponentLink2URL: https://jlcpcb.com/partdetail/C882539; ComponentLink3Description: LCSC Part URL; ComponentLink3URL: https://lcsc.com/product-detail/Multilayer-Ceramic-Capacitors-MLCC---SMD-SMT_Murata-Electronics-Murata-Electronics-GRM1555C2A330JA01D_C882539.html
footprint CAP-0402 (0402 (1005M) Capacitor)
pins: 1, 2

## GRM1555C2A391JE01D
designator C?  Capacitance: 390pF  (hidden comment: *)
Capacitor, Ceramic (MLCC), 390pF, ±5%, 100V, C0G, ±5%, SMD 0402; Manufacturer: Murata Electronics; Manufacturer Part Number: GRM1555C2A391JE01D; Package Size: 0402; JLCPCB Basic Part: No; JLCPCB Part Number: C2986300; Supplier 1: LCSC; Category: Capacitors - MLCC; Supplier Part Number 1: C2986300; Tolerance: ±5%; Voltage Rating: 100V; Temperature Coefficient: C0G; RoHS: Yes; ComponentLink1Description: Datasheet; ComponentLink1URL: https://wmsc.lcsc.com/wmsc/upload/file/pdf/v2/lcsc/2204251600_Murata-Electronics-GRM1555C2A391JE01D_C2986300.pdf; ComponentLink2Description: JLCPCB Part URL; ComponentLink2URL: https://jlcpcb.com/partdetail/C2986300; ComponentLink3Description: LCSC Part URL; ComponentLink3URL: https://lcsc.com/product-detail/Multilayer-Ceramic-Capacitors-MLCC---SMD-SMT_Murata-Electronics-Murata-Electronics-GRM1555C2A391JE01D_C2986300.html
footprint CAP-0402 (0402 (1005M) Capacitor)
pins: 1, 2

## GRM1555C2A470JA01D
designator C?  Capacitance: 47pF  (hidden comment: *)
Capacitor, Ceramic (MLCC), 47pF, ±5%, 100V, C0G, ±5%, SMD 0402; Manufacturer: Murata Electronics; Manufacturer Part Number: GRM1555C2A470JA01D; Package Size: 0402; JLCPCB Basic Part: No; JLCPCB Part Number: C190307; Supplier 1: LCSC; Category: Capacitors - MLCC; Supplier Part Number 1: C190307; Tolerance: ±5%; Voltage Rating: 100V; Temperature Coefficient: C0G; RoHS: Yes; ComponentLink1Description: Datasheet; ComponentLink1URL: https://wmsc.lcsc.com/wmsc/upload/file/pdf/v2/lcsc/1811081522_Murata-Electronics-GRM1555C2A470JA01D_C190307.pdf; ComponentLink2Description: JLCPCB Part URL; ComponentLink2URL: https://jlcpcb.com/partdetail/C190307; ComponentLink3Description: LCSC Part URL; ComponentLink3URL: https://lcsc.com/product-detail/Multilayer-Ceramic-Capacitors-MLCC---SMD-SMT_Murata-Electronics-Murata-Electronics-GRM1555C2A470JA01D_C190307.html
footprint CAP-0402 (0402 (1005M) Capacitor)
pins: 1, 2

## GRM1555C2AR50BA01D
designator C?  Capacitance: 0.5pF  (hidden comment: *)
Capacitor, Ceramic (MLCC), 0.5pF, 100V, C0G, SMD 0402; Manufacturer: Murata Electronics; Manufacturer Part Number: GRM1555C2AR50BA01D; Package Size: 0402; JLCPCB Basic Part: No; JLCPCB Part Number: C464421; Supplier 1: LCSC; Category: Capacitors - MLCC; Supplier Part Number 1: C464421; Voltage Rating: 100V; Temperature Coefficient: C0G; RoHS: Yes; ComponentLink1Description: Datasheet; ComponentLink1URL: https://wmsc.lcsc.com/wmsc/upload/file/pdf/v2/lcsc/2304140030_Murata-Electronics-GRM1555C2AR50BA01D_C464421.pdf; ComponentLink2Description: JLCPCB Part URL; ComponentLink2URL: https://jlcpcb.com/partdetail/C464421; ComponentLink3Description: LCSC Part URL; ComponentLink3URL: https://lcsc.com/product-detail/Multilayer-Ceramic-Capacitors-MLCC---SMD-SMT_Murata-Electronics-Murata-Electronics-GRM1555C2AR50BA01D_C464421.html
footprint CAP-0402 (0402 (1005M) Capacitor)
pins: 1, 2

## GRM1555CYA103GE01D
designator C?  Capacitance: 10nF  (hidden comment: *)
Capacitor, Ceramic (MLCC), 10nF, ±2%, 35V, C0G, ±2%, SMD 0402; Manufacturer: Murata Electronics; Manufacturer Part Number: GRM1555CYA103GE01D; Package Size: 0402; JLCPCB Basic Part: No; JLCPCB Part Number: C3834692; Supplier 1: LCSC; Category: Capacitors - MLCC; Supplier Part Number 1: C3834692; Tolerance: ±2%; Voltage Rating: 35V; Temperature Coefficient: C0G; RoHS: Yes; ComponentLink1Description: Datasheet; ComponentLink1URL: https://wmsc.lcsc.com/wmsc/upload/file/pdf/v2/lcsc/2308111509_Murata-Electronics-GRM1555CYA103GE01D_C3834692.pdf; ComponentLink2Description: JLCPCB Part URL; ComponentLink2URL: https://jlcpcb.com/partdetail/C3834692; ComponentLink3Description: LCSC Part URL; ComponentLink3URL: https://lcsc.com/product-detail/Multilayer-Ceramic-Capacitors-MLCC---SMD-SMT_Murata-Electronics-Murata-Electronics-GRM1555CYA103GE01D_C3834692.html
footprint CAP-0402 (0402 (1005M) Capacitor)
pins: 1, 2

## GRM1557U1A122JA01D
designator C?  Capacitance: 1.2nF  (hidden comment: *)
Capacitor, Ceramic (MLCC), 1.2nF, ±5%, 10V, U2J, ±5%, SMD 0402; Manufacturer: Murata Electronics; Manufacturer Part Number: GRM1557U1A122JA01D; Package Size: 0402; JLCPCB Basic Part: No; JLCPCB Part Number: C882538; Supplier 1: LCSC; Category: Capacitors - MLCC; Supplier Part Number 1: C882538; Tolerance: ±5%; Voltage Rating: 10V; Temperature Coefficient: U2J; RoHS: Yes; ComponentLink1Description: Datasheet; ComponentLink1URL: https://wmsc.lcsc.com/wmsc/upload/file/pdf/v2/lcsc/2201242130_Murata-Electronics-GRM1557U1A122JA01D_C882538.pdf; ComponentLink2Description: JLCPCB Part URL; ComponentLink2URL: https://jlcpcb.com/partdetail/C882538; ComponentLink3Description: LCSC Part URL; ComponentLink3URL: https://lcsc.com/product-detail/Multilayer-Ceramic-Capacitors-MLCC---SMD-SMT_Murata-Electronics-Murata-Electronics-GRM1557U1A122JA01D_C882538.html
footprint CAP-0402 (0402 (1005M) Capacitor)
pins: 1, 2

## GRM1557U1A182JA01D
designator C?  Capacitance: 1.8nF  (hidden comment: *)
Capacitor, Ceramic (MLCC), 1.8nF, ±5%, 10V, U2J, ±5%, SMD 0402; Manufacturer: Murata Electronics; Manufacturer Part Number: GRM1557U1A182JA01D; Package Size: 0402; JLCPCB Basic Part: No; JLCPCB Part Number: C237437; Supplier 1: LCSC; Category: Capacitors - MLCC; Supplier Part Number 1: C237437; Tolerance: ±5%; Voltage Rating: 10V; Temperature Coefficient: U2J; RoHS: Yes; ComponentLink1Description: Datasheet; ComponentLink1URL: https://wmsc.lcsc.com/wmsc/upload/file/pdf/v2/lcsc/2304140030_Murata-Electronics-GRM1557U1A182JA01D_C237437.pdf; ComponentLink2Description: JLCPCB Part URL; ComponentLink2URL: https://jlcpcb.com/partdetail/C237437; ComponentLink3Description: LCSC Part URL; ComponentLink3URL: https://lcsc.com/product-detail/Multilayer-Ceramic-Capacitors-MLCC---SMD-SMT_Murata-Electronics-Murata-Electronics-GRM1557U1A182JA01D_C237437.html
footprint CAP-0402 (0402 (1005M) Capacitor)
pins: 1, 2

## GRM1557U1A272JA01D
designator C?  Capacitance: 2.7nF  (hidden comment: *)
Capacitor, Ceramic (MLCC), 2.7nF, ±5%, 10V, U2J, ±5%, SMD 0402; Manufacturer: Murata Electronics; Manufacturer Part Number: GRM1557U1A272JA01D; Package Size: 0402; JLCPCB Basic Part: No; JLCPCB Part Number: C710858; Supplier 1: LCSC; Category: Capacitors - MLCC; Supplier Part Number 1: C710858; Tolerance: ±5%; Voltage Rating: 10V; Temperature Coefficient: U2J; RoHS: Yes; ComponentLink1Description: Datasheet; ComponentLink1URL: https://wmsc.lcsc.com/wmsc/upload/file/pdf/v2/lcsc/2011170205_Murata-Electronics-GRM1557U1A272JA01D_C710858.pdf; ComponentLink2Description: JLCPCB Part URL; ComponentLink2URL: https://jlcpcb.com/partdetail/C710858; ComponentLink3Description: LCSC Part URL; ComponentLink3URL: https://lcsc.com/product-detail/Multilayer-Ceramic-Capacitors-MLCC---SMD-SMT_Murata-Electronics-Murata-Electronics-GRM1557U1A272JA01D_C710858.html
footprint CAP-0402 (0402 (1005M) Capacitor)
pins: 1, 2

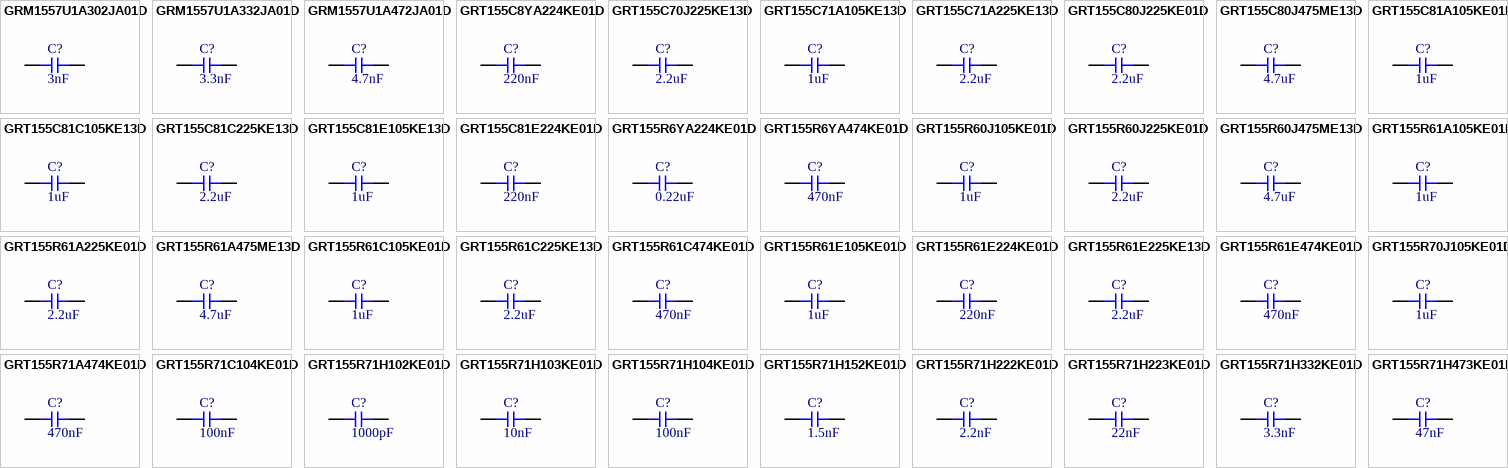
[diagram p75: symbols GRM1557U1A302JA01D to GRT155R71H473KE01D]

## GRM1557U1A302JA01D
designator C?  Capacitance: 3nF  (hidden comment: *)
Capacitor, Ceramic (MLCC), 3nF, ±5%, 10V, U2J, ±5%, SMD 0402; Manufacturer: Murata Electronics; Manufacturer Part Number: GRM1557U1A302JA01D; Package Size: 0402; JLCPCB Basic Part: No; JLCPCB Part Number: C162145; Supplier 1: LCSC; Category: Capacitors - MLCC; Supplier Part Number 1: C162145; Tolerance: ±5%; Voltage Rating: 10V; Temperature Coefficient: U2J; RoHS: Yes; ComponentLink1Description: Datasheet; ComponentLink1URL: https://wmsc.lcsc.com/wmsc/upload/file/pdf/v2/lcsc/1811081546_Murata-Electronics-GRM1557U1A302JA01D_C162145.pdf; ComponentLink2Description: JLCPCB Part URL; ComponentLink2URL: https://jlcpcb.com/partdetail/C162145; ComponentLink3Description: LCSC Part URL; ComponentLink3URL: https://lcsc.com/product-detail/Multilayer-Ceramic-Capacitors-MLCC---SMD-SMT_Murata-Electronics-Murata-Electronics-GRM1557U1A302JA01D_C162145.html
footprint CAP-0402 (0402 (1005M) Capacitor)
pins: 1, 2

## GRM1557U1A332JA01D
designator C?  Capacitance: 3.3nF  (hidden comment: *)
Capacitor, Ceramic (MLCC), 3.3nF, ±5%, 10V, U2J, ±5%, SMD 0402; Manufacturer: Murata Electronics; Manufacturer Part Number: GRM1557U1A332JA01D; Package Size: 0402; JLCPCB Basic Part: No; JLCPCB Part Number: C710859; Supplier 1: LCSC; Category: Capacitors - MLCC; Supplier Part Number 1: C710859; Tolerance: ±5%; Voltage Rating: 10V; Temperature Coefficient: U2J; RoHS: Yes; ComponentLink1Description: Datasheet; ComponentLink1URL: https://wmsc.lcsc.com/wmsc/upload/file/pdf/v2/lcsc/2009181535_Murata-Electronics-GRM1557U1A332JA01D_C710859.pdf; ComponentLink2Description: JLCPCB Part URL; ComponentLink2URL: https://jlcpcb.com/partdetail/C710859; ComponentLink3Description: LCSC Part URL; ComponentLink3URL: https://lcsc.com/product-detail/Multilayer-Ceramic-Capacitors-MLCC---SMD-SMT_Murata-Electronics-Murata-Electronics-GRM1557U1A332JA01D_C710859.html
footprint CAP-0402 (0402 (1005M) Capacitor)
pins: 1, 2

## GRM1557U1A472JA01D
designator C?  Capacitance: 4.7nF  (hidden comment: *)
Capacitor, Ceramic (MLCC), 4.7nF, ±5%, 10V, U2J, ±5%, SMD 0402; Manufacturer: Murata Electronics; Manufacturer Part Number: GRM1557U1A472JA01D; Package Size: 0402; JLCPCB Basic Part: No; JLCPCB Part Number: C389009; Supplier 1: LCSC; Category: Capacitors - MLCC; Supplier Part Number 1: C389009; Tolerance: ±5%; Voltage Rating: 10V; Temperature Coefficient: U2J; RoHS: Yes; ComponentLink1Description: Datasheet; ComponentLink1URL: https://wmsc.lcsc.com/wmsc/upload/file/pdf/v2/lcsc/1912111437_Murata-Electronics-GRM1557U1A472JA01D_C389009.pdf; ComponentLink2Description: JLCPCB Part URL; ComponentLink2URL: https://jlcpcb.com/partdetail/C389009; ComponentLink3Description: LCSC Part URL; ComponentLink3URL: https://lcsc.com/product-detail/Multilayer-Ceramic-Capacitors-MLCC---SMD-SMT_Murata-Electronics-Murata-Electronics-GRM1557U1A472JA01D_C389009.html
footprint CAP-0402 (0402 (1005M) Capacitor)
pins: 1, 2
